# Altium schematic symbol library jlcpcb_2025_04_resistors_extended_1210.schlib: 2670 symbols (part 10 of 14) (continued)
## RC1210FR-0730KL
designator R?  Resistance: 30kΩ  (hidden comment: *)
Resistor, 30kΩ, ±1%, 500mW, ±100ppm/℃, -55℃~+155℃, SMD 1210; Manufacturer: Uniroyal; Manufacturer Part Number: RC1210FR-0730KL; Supplier 1: LCSC; Supplier Part Number 1: C728373; JLCPCB Part Number: C728373; Power Rating: 500mW; Category: Resistors; Package Size: 1210; JLCPCB Basic Part: Yes; Tolerance: ±1%; Temperature Coefficient: ±100ppm/℃; Temperature Rating: -55℃~+155℃; ComponentLink1Description: Datasheet; ComponentLink1URL: https://wmsc.lcsc.com/wmsc/upload/file/pdf/v2/lcsc/2304140030_YAGEO-RC1210FR-0730KL_C728373.pdf; ComponentLink2Description: JLCPCB Part URL; ComponentLink2URL: https://jlcpcb.com/partdetail/C728373
pins: 1, 2
1 alternate drawing of the same symbol

## RC1210FR-0730RL
designator R?  Resistance: 30Ω  (hidden comment: *)
Resistor, 30Ω, ±1%, 500mW, ±100ppm/℃, -55℃~+155℃, SMD 1210; Manufacturer: Uniroyal; Manufacturer Part Number: RC1210FR-0730RL; Supplier 1: LCSC; Supplier Part Number 1: C724011; JLCPCB Part Number: C724011; Power Rating: 500mW; Category: Resistors; Package Size: 1210; JLCPCB Basic Part: Yes; Tolerance: ±1%; Temperature Coefficient: ±100ppm/℃; Temperature Rating: -55℃~+155℃; ComponentLink1Description: Datasheet; ComponentLink1URL: https://wmsc.lcsc.com/wmsc/upload/file/pdf/v2/lcsc/2012102146_YAGEO-RC1210FR-0730RL_C724011.pdf; ComponentLink2Description: JLCPCB Part URL; ComponentLink2URL: https://jlcpcb.com/partdetail/C724011
pins: 1, 2
1 alternate drawing of the same symbol

## RC1210FR-0733KL
designator R?  Resistance: 33kΩ  (hidden comment: *)
Resistor, 33kΩ, ±1%, 500mW, 200V, ±100ppm/℃, -55℃~+155℃, SMD 1210; Manufacturer: Uniroyal; Manufacturer Part Number: RC1210FR-0733KL; Supplier 1: LCSC; Supplier Part Number 1: C874934; JLCPCB Part Number: C874934; Power Rating: 500mW; Category: Resistors; Package Size: 1210; JLCPCB Basic Part: Yes; Tolerance: ±1%; Voltage Rating: 200V; Temperature Coefficient: ±100ppm/℃; Temperature Rating: -55℃~+155℃; ComponentLink1Description: Datasheet; ComponentLink1URL: https://wmsc.lcsc.com/wmsc/upload/file/pdf/v2/lcsc/2112231430_YAGEO-RC1210FR-0733KL_C874934.pdf; ComponentLink2Description: JLCPCB Part URL; ComponentLink2URL: https://jlcpcb.com/partdetail/C874934
pins: 1, 2
1 alternate drawing of the same symbol

## RC1210FR-0733RL
designator R?  Resistance: 33Ω  (hidden comment: *)
Resistor, 33Ω, ±1%, 500mW, ±100ppm/℃, -55℃~+155℃, SMD 1210; Manufacturer: Uniroyal; Manufacturer Part Number: RC1210FR-0733RL; Supplier 1: LCSC; Supplier Part Number 1: C723447; JLCPCB Part Number: C723447; Power Rating: 500mW; Category: Resistors; Package Size: 1210; JLCPCB Basic Part: Yes; Tolerance: ±1%; Temperature Coefficient: ±100ppm/℃; Temperature Rating: -55℃~+155℃; ComponentLink1Description: Datasheet; ComponentLink1URL: https://wmsc.lcsc.com/wmsc/upload/file/pdf/v2/lcsc/2008171306_YAGEO-RC1210FR-0733RL_C723447.pdf; ComponentLink2Description: JLCPCB Part URL; ComponentLink2URL: https://jlcpcb.com/partdetail/C723447
pins: 1, 2
1 alternate drawing of the same symbol

## RC1210FR-0739KL
designator R?  Resistance: 39kΩ  (hidden comment: *)
Resistor, 39kΩ, ±1%, 500mW, 200V, ±100ppm/℃, -55℃~+155℃, SMD 1210; Manufacturer: Uniroyal; Manufacturer Part Number: RC1210FR-0739KL; Supplier 1: LCSC; Supplier Part Number 1: C728378; JLCPCB Part Number: C728378; Power Rating: 500mW; Category: Resistors; Package Size: 1210; JLCPCB Basic Part: Yes; Tolerance: ±1%; Voltage Rating: 200V; Temperature Coefficient: ±100ppm/℃; Temperature Rating: -55℃~+155℃; ComponentLink1Description: Datasheet; ComponentLink1URL: https://wmsc.lcsc.com/wmsc/upload/file/pdf/v2/lcsc/2304140030_YAGEO-RC1210FR-0739KL_C728378.pdf; ComponentLink2Description: JLCPCB Part URL; ComponentLink2URL: https://jlcpcb.com/partdetail/C728378
pins: 1, 2
1 alternate drawing of the same symbol

## RC1210FR-0743RL
designator R?  Resistance: 43Ω  (hidden comment: *)
Resistor, 43Ω, ±1%, 500mW, 200V, ±100ppm/℃, -55℃~+155℃, SMD 1210; Manufacturer: Uniroyal; Manufacturer Part Number: RC1210FR-0743RL; Supplier 1: LCSC; Supplier Part Number 1: C874999; JLCPCB Part Number: C874999; Power Rating: 500mW; Category: Resistors; Package Size: 1210; JLCPCB Basic Part: Yes; Tolerance: ±1%; Voltage Rating: 200V; Temperature Coefficient: ±100ppm/℃; Temperature Rating: -55℃~+155℃; ComponentLink1Description: Datasheet; ComponentLink1URL: https://wmsc.lcsc.com/wmsc/upload/file/pdf/v2/lcsc/2112131830_YAGEO-RC1210FR-0743RL_C874999.pdf; ComponentLink2Description: JLCPCB Part URL; ComponentLink2URL: https://jlcpcb.com/partdetail/C874999
pins: 1, 2
1 alternate drawing of the same symbol

## RC1210FR-0747KL
designator R?  Resistance: 47kΩ  (hidden comment: *)
Resistor, 47kΩ, ±1%, 500mW, ±100ppm/℃, -55℃~+155℃, SMD 1210; Manufacturer: Uniroyal; Manufacturer Part Number: RC1210FR-0747KL; Supplier 1: LCSC; Supplier Part Number 1: C728383; JLCPCB Part Number: C728383; Power Rating: 500mW; Category: Resistors; Package Size: 1210; JLCPCB Basic Part: Yes; Tolerance: ±1%; Temperature Coefficient: ±100ppm/℃; Temperature Rating: -55℃~+155℃; ComponentLink1Description: Datasheet; ComponentLink1URL: https://wmsc.lcsc.com/wmsc/upload/file/pdf/v2/lcsc/2304140030_YAGEO-RC1210FR-0747KL_C728383.pdf; ComponentLink2Description: JLCPCB Part URL; ComponentLink2URL: https://jlcpcb.com/partdetail/C728383
pins: 1, 2
1 alternate drawing of the same symbol

## RC1210FR-0747RL
designator R?  Resistance: 47Ω  (hidden comment: *)
Resistor, 47Ω, ±1%, 500mW, 200V, ±100ppm/℃, -55℃~+155℃, SMD 1210; Manufacturer: Uniroyal; Manufacturer Part Number: RC1210FR-0747RL; Supplier 1: LCSC; Supplier Part Number 1: C718247; JLCPCB Part Number: C718247; Power Rating: 500mW; Category: Resistors; Package Size: 1210; JLCPCB Basic Part: Yes; Tolerance: ±1%; Voltage Rating: 200V; Temperature Coefficient: ±100ppm/℃; Temperature Rating: -55℃~+155℃; ComponentLink1Description: Datasheet; ComponentLink1URL: https://wmsc.lcsc.com/wmsc/upload/file/pdf/v2/lcsc/2009231110_YAGEO-RC1210FR-0747RL_C718247.pdf; ComponentLink2Description: JLCPCB Part URL; ComponentLink2URL: https://jlcpcb.com/partdetail/C718247
pins: 1, 2
1 alternate drawing of the same symbol

## RC1210FR-0749K9L
designator R?  Resistance: 49.9kΩ  (hidden comment: *)
Resistor, 49.9kΩ, ±1%, 500mW, ±100ppm/℃, -55℃~+155℃, SMD 1210; Manufacturer: Uniroyal; Manufacturer Part Number: RC1210FR-0749K9L; Supplier 1: LCSC; Supplier Part Number 1: C875024; JLCPCB Part Number: C875024; Power Rating: 500mW; Category: Resistors; Package Size: 1210; JLCPCB Basic Part: Yes; Tolerance: ±1%; Temperature Coefficient: ±100ppm/℃; Temperature Rating: -55℃~+155℃; ComponentLink1Description: Datasheet; ComponentLink1URL: https://wmsc.lcsc.com/wmsc/upload/file/pdf/v2/lcsc/2203081130_YAGEO-RC1210FR-0749K9L_C875024.pdf; ComponentLink2Description: JLCPCB Part URL; ComponentLink2URL: https://jlcpcb.com/partdetail/C875024
pins: 1, 2
1 alternate drawing of the same symbol

## RC1210FR-0751KL
designator R?  Resistance: 51kΩ  (hidden comment: *)
Resistor, 51kΩ, ±1%, 500mW, 200V, ±100ppm/℃, -55℃~+155℃, SMD 1210; Manufacturer: Uniroyal; Manufacturer Part Number: RC1210FR-0751KL; Supplier 1: LCSC; Supplier Part Number 1: C326793; JLCPCB Part Number: C326793; Power Rating: 500mW; Category: Resistors; Package Size: 1210; JLCPCB Basic Part: Yes; Tolerance: ±1%; Voltage Rating: 200V; Temperature Coefficient: ±100ppm/℃; Temperature Rating: -55℃~+155℃; ComponentLink1Description: Datasheet; ComponentLink1URL: https://wmsc.lcsc.com/wmsc/upload/file/pdf/v2/lcsc/1811141443_YAGEO-RC1210FR-0751KL_C326793.pdf; ComponentLink2Description: JLCPCB Part URL; ComponentLink2URL: https://jlcpcb.com/partdetail/C326793
pins: 1, 2
1 alternate drawing of the same symbol

## RC1210FR-0751R1L
designator R?  Resistance: 51.1Ω  (hidden comment: *)
Resistor, 51.1Ω, ±1%, 500mW, 200V, ±100ppm/℃, -55℃~+155℃, SMD 1210; Manufacturer: Uniroyal; Manufacturer Part Number: RC1210FR-0751R1L; Supplier 1: LCSC; Supplier Part Number 1: C723452; JLCPCB Part Number: C723452; Power Rating: 500mW; Category: Resistors; Package Size: 1210; JLCPCB Basic Part: Yes; Tolerance: ±1%; Voltage Rating: 200V; Temperature Coefficient: ±100ppm/℃; Temperature Rating: -55℃~+155℃; ComponentLink1Description: Datasheet; ComponentLink1URL: https://wmsc.lcsc.com/wmsc/upload/file/pdf/v2/lcsc/2008171306_YAGEO-RC1210FR-0751R1L_C723452.pdf; ComponentLink2Description: JLCPCB Part URL; ComponentLink2URL: https://jlcpcb.com/partdetail/C723452
pins: 1, 2
1 alternate drawing of the same symbol

## RC1210FR-0751RL
designator R?  Resistance: 51Ω  (hidden comment: *)
Resistor, 51Ω, ±1%, 500mW, 200V, ±100ppm/℃, -55℃~+155℃, SMD 1210; Manufacturer: Uniroyal; Manufacturer Part Number: RC1210FR-0751RL; Supplier 1: LCSC; Supplier Part Number 1: C705454; JLCPCB Part Number: C705454; Power Rating: 500mW; Category: Resistors; Package Size: 1210; JLCPCB Basic Part: Yes; Tolerance: ±1%; Voltage Rating: 200V; Temperature Coefficient: ±100ppm/℃; Temperature Rating: -55℃~+155℃; ComponentLink1Description: Datasheet; ComponentLink1URL: https://wmsc.lcsc.com/wmsc/upload/file/pdf/v2/lcsc/2304140030_YAGEO-RC1210FR-0751RL_C705454.pdf; ComponentLink2Description: JLCPCB Part URL; ComponentLink2URL: https://jlcpcb.com/partdetail/C705454
pins: 1, 2
1 alternate drawing of the same symbol

## RC1210FR-0756KL
designator R?  Resistance: 56kΩ  (hidden comment: *)
Resistor, 56kΩ, ±1%, 500mW, 200V, ±100ppm/℃, -55℃~+155℃, SMD 1210; Manufacturer: Uniroyal; Manufacturer Part Number: RC1210FR-0756KL; Supplier 1: LCSC; Supplier Part Number 1: C728388; JLCPCB Part Number: C728388; Power Rating: 500mW; Category: Resistors; Package Size: 1210; JLCPCB Basic Part: Yes; Tolerance: ±1%; Voltage Rating: 200V; Temperature Coefficient: ±100ppm/℃; Temperature Rating: -55℃~+155℃; ComponentLink1Description: Datasheet; ComponentLink1URL: https://wmsc.lcsc.com/wmsc/upload/file/pdf/v2/lcsc/2304140030_YAGEO-RC1210FR-0756KL_C728388.pdf; ComponentLink2Description: JLCPCB Part URL; ComponentLink2URL: https://jlcpcb.com/partdetail/C728388
pins: 1, 2
1 alternate drawing of the same symbol

## RC1210FR-0756RL
designator R?  Resistance: 56Ω  (hidden comment: *)
Resistor, 56Ω, ±1%, 500mW, 200V, ±100ppm/℃, -55℃~+155℃, SMD 1210; Manufacturer: Uniroyal; Manufacturer Part Number: RC1210FR-0756RL; Supplier 1: LCSC; Supplier Part Number 1: C606195; JLCPCB Part Number: C606195; Power Rating: 500mW; Category: Resistors; Package Size: 1210; JLCPCB Basic Part: Yes; Tolerance: ±1%; Voltage Rating: 200V; Temperature Coefficient: ±100ppm/℃; Temperature Rating: -55℃~+155℃; ComponentLink1Description: Datasheet; ComponentLink1URL: https://wmsc.lcsc.com/wmsc/upload/file/pdf/v2/lcsc/2006112331_YAGEO-RC1210FR-0756RL_C606195.pdf; ComponentLink2Description: JLCPCB Part URL; ComponentLink2URL: https://jlcpcb.com/partdetail/C606195
pins: 1, 2
1 alternate drawing of the same symbol

## RC1210FR-0762RL
designator R?  Resistance: 62Ω  (hidden comment: *)
Resistor, 62Ω, ±1%, 500mW, 200V, ±100ppm/℃, -55℃~+155℃, SMD 1210; Manufacturer: Uniroyal; Manufacturer Part Number: RC1210FR-0762RL; Supplier 1: LCSC; Supplier Part Number 1: C705056; JLCPCB Part Number: C705056; Power Rating: 500mW; Category: Resistors; Package Size: 1210; JLCPCB Basic Part: Yes; Tolerance: ±1%; Voltage Rating: 200V; Temperature Coefficient: ±100ppm/℃; Temperature Rating: -55℃~+155℃; ComponentLink1Description: Datasheet; ComponentLink1URL: https://wmsc.lcsc.com/wmsc/upload/file/pdf/v2/lcsc/2304140030_YAGEO-RC1210FR-0762RL_C705056.pdf; ComponentLink2Description: JLCPCB Part URL; ComponentLink2URL: https://jlcpcb.com/partdetail/C705056
pins: 1, 2
1 alternate drawing of the same symbol

## RC1210FR-0768KL
designator R?  Resistance: 68kΩ  (hidden comment: *)
Resistor, 68kΩ, ±1%, 500mW, ±100ppm/℃, -55℃~+155℃, SMD 1210; Manufacturer: Uniroyal; Manufacturer Part Number: RC1210FR-0768KL; Supplier 1: LCSC; Supplier Part Number 1: C875102; JLCPCB Part Number: C875102; Power Rating: 500mW; Category: Resistors; Package Size: 1210; JLCPCB Basic Part: Yes; Tolerance: ±1%; Temperature Coefficient: ±100ppm/℃; Temperature Rating: -55℃~+155℃; ComponentLink1Description: Datasheet; ComponentLink1URL: https://wmsc.lcsc.com/wmsc/upload/file/pdf/v2/lcsc/2404241554_YAGEO-RC1210FR-0768KL_C875102.pdf; ComponentLink2Description: JLCPCB Part URL; ComponentLink2URL: https://jlcpcb.com/partdetail/C875102
pins: 1, 2
1 alternate drawing of the same symbol

## RC1210FR-0768RL
designator R?  Resistance: 68Ω  (hidden comment: *)
Resistor, 68Ω, ±1%, 500mW, 200V, ±100ppm/℃, -55℃~+155℃, SMD 1210; Manufacturer: Uniroyal; Manufacturer Part Number: RC1210FR-0768RL; Supplier 1: LCSC; Supplier Part Number 1: C137091; JLCPCB Part Number: C137091; Power Rating: 500mW; Category: Resistors; Package Size: 1210; JLCPCB Basic Part: Yes; Tolerance: ±1%; Voltage Rating: 200V; Temperature Coefficient: ±100ppm/℃; Temperature Rating: -55℃~+155℃; ComponentLink1Description: Datasheet; ComponentLink1URL: https://wmsc.lcsc.com/wmsc/upload/file/pdf/v2/lcsc/2304140030_YAGEO-RC1210FR-0768RL_C137091.pdf; ComponentLink2Description: JLCPCB Part URL; ComponentLink2URL: https://jlcpcb.com/partdetail/C137091
pins: 1, 2
1 alternate drawing of the same symbol

## RC1210FR-0773R2L
designator R?  Resistance: 73.2Ω  (hidden comment: *)
Resistor, 73.2Ω, ±1%, 500mW, 200V, ±100ppm/℃, -55℃~+155℃, SMD 1210; Manufacturer: Uniroyal; Manufacturer Part Number: RC1210FR-0773R2L; Supplier 1: LCSC; Supplier Part Number 1: C705456; JLCPCB Part Number: C705456; Power Rating: 500mW; Category: Resistors; Package Size: 1210; JLCPCB Basic Part: Yes; Tolerance: ±1%; Voltage Rating: 200V; Temperature Coefficient: ±100ppm/℃; Temperature Rating: -55℃~+155℃; ComponentLink1Description: Datasheet; ComponentLink1URL: https://wmsc.lcsc.com/wmsc/upload/file/pdf/v2/lcsc/2304140030_YAGEO-RC1210FR-0773R2L_C705456.pdf; ComponentLink2Description: JLCPCB Part URL; ComponentLink2URL: https://jlcpcb.com/partdetail/C705456
pins: 1, 2
1 alternate drawing of the same symbol

## RC1210FR-0775KL
designator R?  Resistance: 75kΩ  (hidden comment: *)
Resistor, 75kΩ, ±1%, 500mW, 200V, ±100ppm/℃, -55℃~+155℃, SMD 1210; Manufacturer: Uniroyal; Manufacturer Part Number: RC1210FR-0775KL; Supplier 1: LCSC; Supplier Part Number 1: C606196; JLCPCB Part Number: C606196; Power Rating: 500mW; Category: Resistors; Package Size: 1210; JLCPCB Basic Part: Yes; Tolerance: ±1%; Voltage Rating: 200V; Temperature Coefficient: ±100ppm/℃; Temperature Rating: -55℃~+155℃; ComponentLink1Description: Datasheet; ComponentLink1URL: https://wmsc.lcsc.com/wmsc/upload/file/pdf/v2/lcsc/2006112331_YAGEO-RC1210FR-0775KL_C606196.pdf; ComponentLink2Description: JLCPCB Part URL; ComponentLink2URL: https://jlcpcb.com/partdetail/C606196
pins: 1, 2
1 alternate drawing of the same symbol

## RC1210FR-0775RL
designator R?  Resistance: 75Ω  (hidden comment: *)
Resistor, 75Ω, ±1%, 500mW, 200V, ±100ppm/℃, -55℃~+155℃, SMD 1210; Manufacturer: Uniroyal; Manufacturer Part Number: RC1210FR-0775RL; Supplier 1: LCSC; Supplier Part Number 1: C470030; JLCPCB Part Number: C470030; Power Rating: 500mW; Category: Resistors; Package Size: 1210; JLCPCB Basic Part: Yes; Tolerance: ±1%; Voltage Rating: 200V; Temperature Coefficient: ±100ppm/℃; Temperature Rating: -55℃~+155℃; ComponentLink1Description: Datasheet; ComponentLink1URL: https://wmsc.lcsc.com/wmsc/upload/file/pdf/v2/lcsc/2311211102_YAGEO-RC1210FR-0775RL_C470030.pdf; ComponentLink2Description: JLCPCB Part URL; ComponentLink2URL: https://jlcpcb.com/partdetail/C470030
pins: 1, 2
1 alternate drawing of the same symbol

## RC1210FR-0782KL
designator R?  Resistance: 82kΩ  (hidden comment: *)
Resistor, 82kΩ, ±1%, 500mW, 200V, ±100ppm/℃, -55℃~+155℃, SMD 1210; Manufacturer: Uniroyal; Manufacturer Part Number: RC1210FR-0782KL; Supplier 1: LCSC; Supplier Part Number 1: C728394; JLCPCB Part Number: C728394; Power Rating: 500mW; Category: Resistors; Package Size: 1210; JLCPCB Basic Part: Yes; Tolerance: ±1%; Voltage Rating: 200V; Temperature Coefficient: ±100ppm/℃; Temperature Rating: -55℃~+155℃; ComponentLink1Description: Datasheet; ComponentLink1URL: https://wmsc.lcsc.com/wmsc/upload/file/pdf/v2/lcsc/2304140030_YAGEO-RC1210FR-0782KL_C728394.pdf; ComponentLink2Description: JLCPCB Part URL; ComponentLink2URL: https://jlcpcb.com/partdetail/C728394
pins: 1, 2
1 alternate drawing of the same symbol

## RC1210FR-0788R7L
designator R?  Resistance: 88.7Ω  (hidden comment: *)
Resistor, 88.7Ω, ±1%, 500mW, 200V, ±100ppm/℃, -55℃~+155℃, SMD 1210; Manufacturer: Uniroyal; Manufacturer Part Number: RC1210FR-0788R7L; Supplier 1: LCSC; Supplier Part Number 1: C728396; JLCPCB Part Number: C728396; Power Rating: 500mW; Category: Resistors; Package Size: 1210; JLCPCB Basic Part: Yes; Tolerance: ±1%; Voltage Rating: 200V; Temperature Coefficient: ±100ppm/℃; Temperature Rating: -55℃~+155℃; ComponentLink1Description: Datasheet; ComponentLink1URL: https://wmsc.lcsc.com/wmsc/upload/file/pdf/v2/lcsc/2304140030_YAGEO-RC1210FR-0788R7L_C728396.pdf; ComponentLink2Description: JLCPCB Part URL; ComponentLink2URL: https://jlcpcb.com/partdetail/C728396
pins: 1, 2
1 alternate drawing of the same symbol

## RC1210FR-0790R9L
designator R?  Resistance: 90.9Ω  (hidden comment: *)
Resistor, 90.9Ω, ±1%, 500mW, 200V, ±100ppm/℃, -55℃~+155℃, SMD 1210; Manufacturer: Uniroyal; Manufacturer Part Number: RC1210FR-0790R9L; Supplier 1: LCSC; Supplier Part Number 1: C723481; JLCPCB Part Number: C723481; Power Rating: 500mW; Category: Resistors; Package Size: 1210; JLCPCB Basic Part: Yes; Tolerance: ±1%; Voltage Rating: 200V; Temperature Coefficient: ±100ppm/℃; Temperature Rating: -55℃~+155℃; ComponentLink1Description: Datasheet; ComponentLink1URL: https://wmsc.lcsc.com/wmsc/upload/file/pdf/v2/lcsc/2008171307_YAGEO-RC1210FR-0790R9L_C723481.pdf; ComponentLink2Description: JLCPCB Part URL; ComponentLink2URL: https://jlcpcb.com/partdetail/C723481
pins: 1, 2
1 alternate drawing of the same symbol

## RC1210FR-07100KL
designator R?  Resistance: 100kΩ  (hidden comment: *)
Resistor, 100kΩ, ±1%, 500mW, 200V, ±100ppm/℃, -55℃~+155℃, SMD 1210; Manufacturer: Uniroyal; Manufacturer Part Number: RC1210FR-07100KL; Supplier 1: LCSC; Supplier Part Number 1: C375531; JLCPCB Part Number: C375531; Power Rating: 500mW; Category: Resistors; Package Size: 1210; JLCPCB Basic Part: Yes; Tolerance: ±1%; Voltage Rating: 200V; Temperature Coefficient: ±100ppm/℃; Temperature Rating: -55℃~+155℃; ComponentLink1Description: Datasheet; ComponentLink1URL: https://wmsc.lcsc.com/wmsc/upload/file/pdf/v2/lcsc/1912111437_YAGEO-RC1210FR-07100KL_C375531.pdf; ComponentLink2Description: JLCPCB Part URL; ComponentLink2URL: https://jlcpcb.com/partdetail/C375531
pins: 1, 2
1 alternate drawing of the same symbol

## RC1210FR-07110KL
designator R?  Resistance: 110kΩ  (hidden comment: *)
Resistor, 110kΩ, ±1%, 500mW, 200V, ±100ppm/℃, -55℃~+155℃, SMD 1210; Manufacturer: Uniroyal; Manufacturer Part Number: RC1210FR-07110KL; Supplier 1: LCSC; Supplier Part Number 1: C728358; JLCPCB Part Number: C728358; Power Rating: 500mW; Category: Resistors; Package Size: 1210; JLCPCB Basic Part: Yes; Tolerance: ±1%; Voltage Rating: 200V; Temperature Coefficient: ±100ppm/℃; Temperature Rating: -55℃~+155℃; ComponentLink1Description: Datasheet; ComponentLink1URL: https://wmsc.lcsc.com/wmsc/upload/file/pdf/v2/lcsc/2304140030_YAGEO-RC1210FR-07110KL_C728358.pdf; ComponentLink2Description: JLCPCB Part URL; ComponentLink2URL: https://jlcpcb.com/partdetail/C728358
pins: 1, 2
1 alternate drawing of the same symbol

## RC1210FR-07115KL
designator R?  Resistance: 115kΩ  (hidden comment: *)
Resistor, 115kΩ, ±1%, 500mW, ±100ppm/℃, -55℃~+155℃, SMD 1210; Manufacturer: Uniroyal; Manufacturer Part Number: RC1210FR-07115KL; Supplier 1: LCSC; Supplier Part Number 1: C723646; JLCPCB Part Number: C723646; Power Rating: 500mW; Category: Resistors; Package Size: 1210; JLCPCB Basic Part: Yes; Tolerance: ±1%; Temperature Coefficient: ±100ppm/℃; Temperature Rating: -55℃~+155℃; ComponentLink1Description: Datasheet; ComponentLink1URL: https://wmsc.lcsc.com/wmsc/upload/file/pdf/v2/lcsc/2008171335_YAGEO-RC1210FR-07115KL_C723646.pdf; ComponentLink2Description: JLCPCB Part URL; ComponentLink2URL: https://jlcpcb.com/partdetail/C723646
pins: 1, 2
1 alternate drawing of the same symbol

## RC1210FR-07120RL
designator R?  Resistance: 120Ω  (hidden comment: *)
Resistor, 120Ω, ±1%, 500mW, 200V, ±100ppm/℃, -55℃~+155℃, SMD 1210; Manufacturer: Uniroyal; Manufacturer Part Number: RC1210FR-07120RL; Supplier 1: LCSC; Supplier Part Number 1: C137105; JLCPCB Part Number: C137105; Power Rating: 500mW; Category: Resistors; Package Size: 1210; JLCPCB Basic Part: Yes; Tolerance: ±1%; Voltage Rating: 200V; Temperature Coefficient: ±100ppm/℃; Temperature Rating: -55℃~+155℃; ComponentLink1Description: Datasheet; ComponentLink1URL: https://wmsc.lcsc.com/wmsc/upload/file/pdf/v2/lcsc/2304140030_YAGEO-RC1210FR-07120RL_C137105.pdf; ComponentLink2Description: JLCPCB Part URL; ComponentLink2URL: https://jlcpcb.com/partdetail/C137105
pins: 1, 2
1 alternate drawing of the same symbol

## RC1210FR-07121RL
designator R?  Resistance: 121Ω  (hidden comment: *)
Resistor, 121Ω, ±1%, 500mW, 200V, ±100ppm/℃, -55℃~+155℃, SMD 1210; Manufacturer: Uniroyal; Manufacturer Part Number: RC1210FR-07121RL; Supplier 1: LCSC; Supplier Part Number 1: C874691; JLCPCB Part Number: C874691; Power Rating: 500mW; Category: Resistors; Package Size: 1210; JLCPCB Basic Part: Yes; Tolerance: ±1%; Voltage Rating: 200V; Temperature Coefficient: ±100ppm/℃; Temperature Rating: -55℃~+155℃; ComponentLink1Description: Datasheet; ComponentLink1URL: https://wmsc.lcsc.com/wmsc/upload/file/pdf/v2/lcsc/2201242130_YAGEO-RC1210FR-07121RL_C874691.pdf; ComponentLink2Description: JLCPCB Part URL; ComponentLink2URL: https://jlcpcb.com/partdetail/C874691
pins: 1, 2
1 alternate drawing of the same symbol

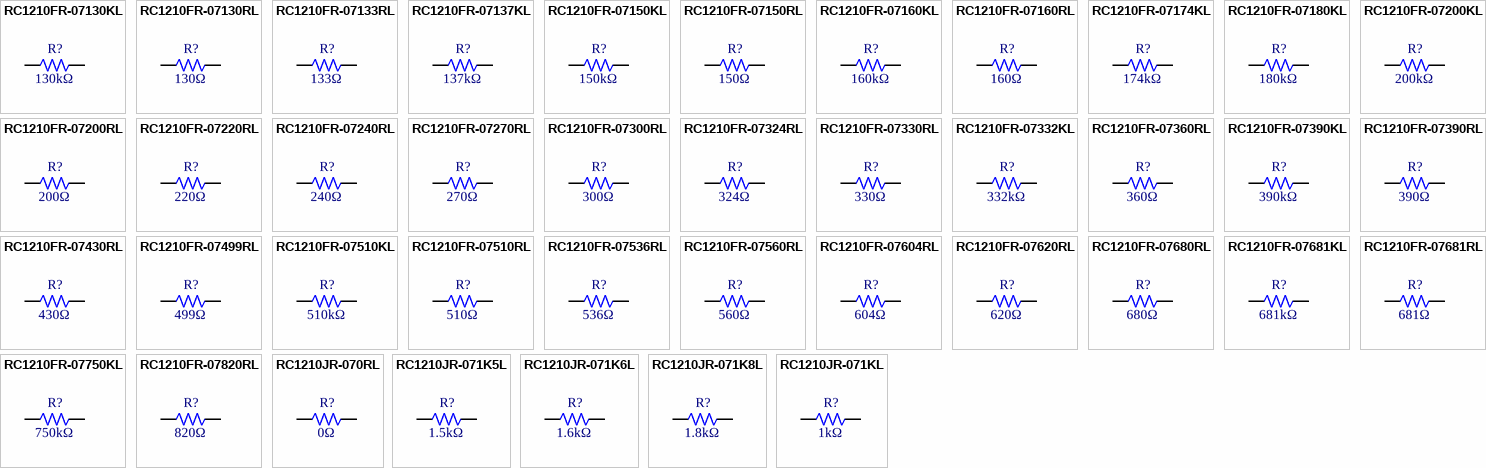
[diagram p48: symbols RC1210FR-07130KL to RC1210JR-071KL]

## RC1210FR-07130KL
designator R?  Resistance: 130kΩ  (hidden comment: *)
Resistor, 130kΩ, ±1%, 500mW, 200V, ±100ppm/℃, -55℃~+155℃, SMD 1210; Manufacturer: Uniroyal; Manufacturer Part Number: RC1210FR-07130KL; Supplier 1: LCSC; Supplier Part Number 1: C874703; JLCPCB Part Number: C874703; Power Rating: 500mW; Category: Resistors; Package Size: 1210; JLCPCB Basic Part: Yes; Tolerance: ±1%; Voltage Rating: 200V; Temperature Coefficient: ±100ppm/℃; Temperature Rating: -55℃~+155℃; ComponentLink1Description: Datasheet; ComponentLink1URL: https://wmsc.lcsc.com/wmsc/upload/file/pdf/v2/lcsc/2201242130_YAGEO-RC1210FR-07130KL_C874703.pdf; ComponentLink2Description: JLCPCB Part URL; ComponentLink2URL: https://jlcpcb.com/partdetail/C874703
pins: 1, 2
1 alternate drawing of the same symbol

## RC1210FR-07130RL
designator R?  Resistance: 130Ω  (hidden comment: *)
Resistor, 130Ω, ±1%, 500mW, 200V, ±100ppm/℃, -55℃~+155℃, SMD 1210; Manufacturer: Uniroyal; Manufacturer Part Number: RC1210FR-07130RL; Supplier 1: LCSC; Supplier Part Number 1: C728362; JLCPCB Part Number: C728362; Power Rating: 500mW; Category: Resistors; Package Size: 1210; JLCPCB Basic Part: Yes; Tolerance: ±1%; Voltage Rating: 200V; Temperature Coefficient: ±100ppm/℃; Temperature Rating: -55℃~+155℃; ComponentLink1Description: Datasheet; ComponentLink1URL: https://wmsc.lcsc.com/wmsc/upload/file/pdf/v2/lcsc/2304140030_YAGEO-RC1210FR-07130RL_C728362.pdf; ComponentLink2Description: JLCPCB Part URL; ComponentLink2URL: https://jlcpcb.com/partdetail/C728362
pins: 1, 2
1 alternate drawing of the same symbol

## RC1210FR-07133RL
designator R?  Resistance: 133Ω  (hidden comment: *)
Resistor, 133Ω, ±1%, 500mW, 200V, ±100ppm/℃, -55℃~+155℃, SMD 1210; Manufacturer: Uniroyal; Manufacturer Part Number: RC1210FR-07133RL; Supplier 1: LCSC; Supplier Part Number 1: C723673; JLCPCB Part Number: C723673; Power Rating: 500mW; Category: Resistors; Package Size: 1210; JLCPCB Basic Part: Yes; Tolerance: ±1%; Voltage Rating: 200V; Temperature Coefficient: ±100ppm/℃; Temperature Rating: -55℃~+155℃; ComponentLink1Description: Datasheet; ComponentLink1URL: https://wmsc.lcsc.com/wmsc/upload/file/pdf/v2/lcsc/2008201237_YAGEO-RC1210FR-07133RL_C723673.pdf; ComponentLink2Description: JLCPCB Part URL; ComponentLink2URL: https://jlcpcb.com/partdetail/C723673
pins: 1, 2
1 alternate drawing of the same symbol

## RC1210FR-07137KL
designator R?  Resistance: 137kΩ  (hidden comment: *)
Resistor, 137kΩ, ±1%, 500mW, 200V, ±100ppm/℃, -55℃~+155℃, SMD 1210; Manufacturer: Uniroyal; Manufacturer Part Number: RC1210FR-07137KL; Supplier 1: LCSC; Supplier Part Number 1: C137104; JLCPCB Part Number: C137104; Power Rating: 500mW; Category: Resistors; Package Size: 1210; JLCPCB Basic Part: Yes; Tolerance: ±1%; Voltage Rating: 200V; Temperature Coefficient: ±100ppm/℃; Temperature Rating: -55℃~+155℃; ComponentLink1Description: Datasheet; ComponentLink1URL: https://wmsc.lcsc.com/wmsc/upload/file/pdf/v2/lcsc/2304140030_YAGEO-RC1210FR-07137KL_C137104.pdf; ComponentLink2Description: JLCPCB Part URL; ComponentLink2URL: https://jlcpcb.com/partdetail/C137104
pins: 1, 2
1 alternate drawing of the same symbol

## RC1210FR-07150KL
designator R?  Resistance: 150kΩ  (hidden comment: *)
Resistor, 150kΩ, ±1%, 500mW, 200V, ±100ppm/℃, -55℃~+155℃, SMD 1210; Manufacturer: Uniroyal; Manufacturer Part Number: RC1210FR-07150KL; Supplier 1: LCSC; Supplier Part Number 1: C137103; JLCPCB Part Number: C137103; Power Rating: 500mW; Category: Resistors; Package Size: 1210; JLCPCB Basic Part: Yes; Tolerance: ±1%; Voltage Rating: 200V; Temperature Coefficient: ±100ppm/℃; Temperature Rating: -55℃~+155℃; ComponentLink1Description: Datasheet; ComponentLink1URL: https://wmsc.lcsc.com/wmsc/upload/file/pdf/v2/lcsc/2304140030_YAGEO-RC1210FR-07150KL_C137103.pdf; ComponentLink2Description: JLCPCB Part URL; ComponentLink2URL: https://jlcpcb.com/partdetail/C137103
pins: 1, 2
1 alternate drawing of the same symbol

## RC1210FR-07150RL
designator R?  Resistance: 150Ω  (hidden comment: *)
Resistor, 150Ω, ±1%, 500mW, ±100ppm/℃, -55℃~+155℃, SMD 1210; Manufacturer: Uniroyal; Manufacturer Part Number: RC1210FR-07150RL; Supplier 1: LCSC; Supplier Part Number 1: C874724; JLCPCB Part Number: C874724; Power Rating: 500mW; Category: Resistors; Package Size: 1210; JLCPCB Basic Part: Yes; Tolerance: ±1%; Temperature Coefficient: ±100ppm/℃; Temperature Rating: -55℃~+155℃; ComponentLink1Description: Datasheet; ComponentLink1URL: https://wmsc.lcsc.com/wmsc/upload/file/pdf/v2/lcsc/2210201630_YAGEO-RC1210FR-07150RL_C874724.pdf; ComponentLink2Description: JLCPCB Part URL; ComponentLink2URL: https://jlcpcb.com/partdetail/C874724
pins: 1, 2
1 alternate drawing of the same symbol

## RC1210FR-07160KL
designator R?  Resistance: 160kΩ  (hidden comment: *)
Resistor, 160kΩ, ±1%, 500mW, ±100ppm/℃, -55℃~+155℃, SMD 1210; Manufacturer: Uniroyal; Manufacturer Part Number: RC1210FR-07160KL; Supplier 1: LCSC; Supplier Part Number 1: C728363; JLCPCB Part Number: C728363; Power Rating: 500mW; Category: Resistors; Package Size: 1210; JLCPCB Basic Part: Yes; Tolerance: ±1%; Temperature Coefficient: ±100ppm/℃; Temperature Rating: -55℃~+155℃; ComponentLink1Description: Datasheet; ComponentLink1URL: https://wmsc.lcsc.com/wmsc/upload/file/pdf/v2/lcsc/2304140030_YAGEO-RC1210FR-07160KL_C728363.pdf; ComponentLink2Description: JLCPCB Part URL; ComponentLink2URL: https://jlcpcb.com/partdetail/C728363
pins: 1, 2
1 alternate drawing of the same symbol

## RC1210FR-07160RL
designator R?  Resistance: 160Ω  (hidden comment: *)
Resistor, 160Ω, ±1%, 500mW, 200V, ±100ppm/℃, -55℃~+155℃, SMD 1210; Manufacturer: Uniroyal; Manufacturer Part Number: RC1210FR-07160RL; Supplier 1: LCSC; Supplier Part Number 1: C784589; JLCPCB Part Number: C784589; Power Rating: 500mW; Category: Resistors; Package Size: 1210; JLCPCB Basic Part: Yes; Tolerance: ±1%; Voltage Rating: 200V; Temperature Coefficient: ±100ppm/℃; Temperature Rating: -55℃~+155℃; ComponentLink1Description: Datasheet; ComponentLink1URL: https://wmsc.lcsc.com/wmsc/upload/file/pdf/v2/lcsc/2011271106_YAGEO-RC1210FR-07160RL_C784589.pdf; ComponentLink2Description: JLCPCB Part URL; ComponentLink2URL: https://jlcpcb.com/partdetail/C784589
pins: 1, 2
1 alternate drawing of the same symbol

## RC1210FR-07174KL
designator R?  Resistance: 174kΩ  (hidden comment: *)
Resistor, 174kΩ, ±1%, 500mW, 200V, ±100ppm/℃, -55℃~+155℃, SMD 1210; Manufacturer: Uniroyal; Manufacturer Part Number: RC1210FR-07174KL; Supplier 1: LCSC; Supplier Part Number 1: C275640; JLCPCB Part Number: C275640; Power Rating: 500mW; Category: Resistors; Package Size: 1210; JLCPCB Basic Part: Yes; Tolerance: ±1%; Voltage Rating: 200V; Temperature Coefficient: ±100ppm/℃; Temperature Rating: -55℃~+155℃; ComponentLink1Description: Datasheet; ComponentLink1URL: https://wmsc.lcsc.com/wmsc/upload/file/pdf/v2/lcsc/2304140030_YAGEO-RC1210FR-07174KL_C275640.pdf; ComponentLink2Description: JLCPCB Part URL; ComponentLink2URL: https://jlcpcb.com/partdetail/C275640
pins: 1, 2
1 alternate drawing of the same symbol

## RC1210FR-07180KL
designator R?  Resistance: 180kΩ  (hidden comment: *)
Resistor, 180kΩ, ±1%, 500mW, ±100ppm/℃, -55℃~+155℃, SMD 1210; Manufacturer: Uniroyal; Manufacturer Part Number: RC1210FR-07180KL; Supplier 1: LCSC; Supplier Part Number 1: C728364; JLCPCB Part Number: C728364; Power Rating: 500mW; Category: Resistors; Package Size: 1210; JLCPCB Basic Part: Yes; Tolerance: ±1%; Temperature Coefficient: ±100ppm/℃; Temperature Rating: -55℃~+155℃; ComponentLink1Description: Datasheet; ComponentLink1URL: https://wmsc.lcsc.com/wmsc/upload/file/pdf/v2/lcsc/2304140030_YAGEO-RC1210FR-07180KL_C728364.pdf; ComponentLink2Description: JLCPCB Part URL; ComponentLink2URL: https://jlcpcb.com/partdetail/C728364
pins: 1, 2
1 alternate drawing of the same symbol

## RC1210FR-07200KL
designator R?  Resistance: 200kΩ  (hidden comment: *)
Resistor, 200kΩ, ±1%, 500mW, 200V, ±100ppm/℃, -55℃~+155℃, SMD 1210; Manufacturer: Uniroyal; Manufacturer Part Number: RC1210FR-07200KL; Supplier 1: LCSC; Supplier Part Number 1: C83148; JLCPCB Part Number: C83148; Power Rating: 500mW; Category: Resistors; Package Size: 1210; JLCPCB Basic Part: Yes; Tolerance: ±1%; Voltage Rating: 200V; Temperature Coefficient: ±100ppm/℃; Temperature Rating: -55℃~+155℃; ComponentLink1Description: Datasheet; ComponentLink1URL: https://wmsc.lcsc.com/wmsc/upload/file/pdf/v2/lcsc/2304140030_YAGEO-RC1210FR-07200KL_C83148.pdf; ComponentLink2Description: JLCPCB Part URL; ComponentLink2URL: https://jlcpcb.com/partdetail/C83148
pins: 1, 2
1 alternate drawing of the same symbol

## RC1210FR-07200RL
designator R?  Resistance: 200Ω  (hidden comment: *)
Resistor, 200Ω, ±1%, 500mW, 200V, ±100ppm/℃, -55℃~+155℃, SMD 1210; Manufacturer: Uniroyal; Manufacturer Part Number: RC1210FR-07200RL; Supplier 1: LCSC; Supplier Part Number 1: C728367; JLCPCB Part Number: C728367; Power Rating: 500mW; Category: Resistors; Package Size: 1210; JLCPCB Basic Part: Yes; Tolerance: ±1%; Voltage Rating: 200V; Temperature Coefficient: ±100ppm/℃; Temperature Rating: -55℃~+155℃; ComponentLink1Description: Datasheet; ComponentLink1URL: https://wmsc.lcsc.com/wmsc/upload/file/pdf/v2/lcsc/2304140030_YAGEO-RC1210FR-07200RL_C728367.pdf; ComponentLink2Description: JLCPCB Part URL; ComponentLink2URL: https://jlcpcb.com/partdetail/C728367
pins: 1, 2
1 alternate drawing of the same symbol

## RC1210FR-07220RL
designator R?  Resistance: 220Ω  (hidden comment: *)
Resistor, 220Ω, ±1%, 500mW, 200V, ±100ppm/℃, -55℃~+155℃, SMD 1210; Manufacturer: Uniroyal; Manufacturer Part Number: RC1210FR-07220RL; Supplier 1: LCSC; Supplier Part Number 1: C137099; JLCPCB Part Number: C137099; Power Rating: 500mW; Category: Resistors; Package Size: 1210; JLCPCB Basic Part: Yes; Tolerance: ±1%; Voltage Rating: 200V; Temperature Coefficient: ±100ppm/℃; Temperature Rating: -55℃~+155℃; ComponentLink1Description: Datasheet; ComponentLink1URL: https://wmsc.lcsc.com/wmsc/upload/file/pdf/v2/lcsc/2304140030_YAGEO-RC1210FR-07220RL_C137099.pdf; ComponentLink2Description: JLCPCB Part URL; ComponentLink2URL: https://jlcpcb.com/partdetail/C137099
pins: 1, 2
1 alternate drawing of the same symbol

## RC1210FR-07240RL
designator R?  Resistance: 240Ω  (hidden comment: *)
Resistor, 240Ω, ±1%, 500mW, 200V, ±100ppm/℃, -55℃~+155℃, SMD 1210; Manufacturer: Uniroyal; Manufacturer Part Number: RC1210FR-07240RL; Supplier 1: LCSC; Supplier Part Number 1: C163354; JLCPCB Part Number: C163354; Power Rating: 500mW; Category: Resistors; Package Size: 1210; JLCPCB Basic Part: Yes; Tolerance: ±1%; Voltage Rating: 200V; Temperature Coefficient: ±100ppm/℃; Temperature Rating: -55℃~+155℃; ComponentLink1Description: Datasheet; ComponentLink1URL: https://wmsc.lcsc.com/wmsc/upload/file/pdf/v2/lcsc/2304140030_YAGEO-RC1210FR-07240RL_C163354.pdf; ComponentLink2Description: JLCPCB Part URL; ComponentLink2URL: https://jlcpcb.com/partdetail/C163354
pins: 1, 2
1 alternate drawing of the same symbol

## RC1210FR-07270RL
designator R?  Resistance: 270Ω  (hidden comment: *)
Resistor, 270Ω, ±1%, 500mW, 200V, ±100ppm/℃, -55℃~+155℃, SMD 1210; Manufacturer: Uniroyal; Manufacturer Part Number: RC1210FR-07270RL; Supplier 1: LCSC; Supplier Part Number 1: C83145; JLCPCB Part Number: C83145; Power Rating: 500mW; Category: Resistors; Package Size: 1210; JLCPCB Basic Part: Yes; Tolerance: ±1%; Voltage Rating: 200V; Temperature Coefficient: ±100ppm/℃; Temperature Rating: -55℃~+155℃; ComponentLink1Description: Datasheet; ComponentLink1URL: https://wmsc.lcsc.com/wmsc/upload/file/pdf/v2/lcsc/2005111002_YAGEO-RC1210FR-07270RL_C83145.pdf; ComponentLink2Description: JLCPCB Part URL; ComponentLink2URL: https://jlcpcb.com/partdetail/C83145
pins: 1, 2
1 alternate drawing of the same symbol

## RC1210FR-07300RL
designator R?  Resistance: 300Ω  (hidden comment: *)
Resistor, 300Ω, ±1%, 500mW, 200V, ±100ppm/℃, -55℃~+155℃, SMD 1210; Manufacturer: Uniroyal; Manufacturer Part Number: RC1210FR-07300RL; Supplier 1: LCSC; Supplier Part Number 1: C137096; JLCPCB Part Number: C137096; Power Rating: 500mW; Category: Resistors; Package Size: 1210; JLCPCB Basic Part: Yes; Tolerance: ±1%; Voltage Rating: 200V; Temperature Coefficient: ±100ppm/℃; Temperature Rating: -55℃~+155℃; ComponentLink1Description: Datasheet; ComponentLink1URL: https://wmsc.lcsc.com/wmsc/upload/file/pdf/v2/lcsc/2304140030_YAGEO-RC1210FR-07300RL_C137096.pdf; ComponentLink2Description: JLCPCB Part URL; ComponentLink2URL: https://jlcpcb.com/partdetail/C137096
pins: 1, 2
1 alternate drawing of the same symbol

## RC1210FR-07324RL
designator R?  Resistance: 324Ω  (hidden comment: *)
Resistor, 324Ω, ±1%, 500mW, 200V, ±100ppm/℃, -55℃~+155℃, SMD 1210; Manufacturer: Uniroyal; Manufacturer Part Number: RC1210FR-07324RL; Supplier 1: LCSC; Supplier Part Number 1: C705055; JLCPCB Part Number: C705055; Power Rating: 500mW; Category: Resistors; Package Size: 1210; JLCPCB Basic Part: Yes; Tolerance: ±1%; Voltage Rating: 200V; Temperature Coefficient: ±100ppm/℃; Temperature Rating: -55℃~+155℃; ComponentLink1Description: Datasheet; ComponentLink1URL: https://wmsc.lcsc.com/wmsc/upload/file/pdf/v2/lcsc/2304140030_YAGEO-RC1210FR-07324RL_C705055.pdf; ComponentLink2Description: JLCPCB Part URL; ComponentLink2URL: https://jlcpcb.com/partdetail/C705055
pins: 1, 2
1 alternate drawing of the same symbol

## RC1210FR-07330RL
designator R?  Resistance: 330Ω  (hidden comment: *)
Resistor, 330Ω, ±1%, 500mW, 200V, ±100ppm/℃, -55℃~+155℃, SMD 1210; Manufacturer: Uniroyal; Manufacturer Part Number: RC1210FR-07330RL; Supplier 1: LCSC; Supplier Part Number 1: C163353; JLCPCB Part Number: C163353; Power Rating: 500mW; Category: Resistors; Package Size: 1210; JLCPCB Basic Part: Yes; Tolerance: ±1%; Voltage Rating: 200V; Temperature Coefficient: ±100ppm/℃; Temperature Rating: -55℃~+155℃; ComponentLink1Description: Datasheet; ComponentLink1URL: https://wmsc.lcsc.com/wmsc/upload/file/pdf/v2/lcsc/2304140030_YAGEO-RC1210FR-07330RL_C163353.pdf; ComponentLink2Description: JLCPCB Part URL; ComponentLink2URL: https://jlcpcb.com/partdetail/C163353
pins: 1, 2
1 alternate drawing of the same symbol

## RC1210FR-07332KL
designator R?  Resistance: 332kΩ  (hidden comment: *)
Resistor, 332kΩ, ±1%, 500mW, ±100ppm/℃, -55℃~+155℃, SMD 1210; Manufacturer: Uniroyal; Manufacturer Part Number: RC1210FR-07332KL; Supplier 1: LCSC; Supplier Part Number 1: C728374; JLCPCB Part Number: C728374; Power Rating: 500mW; Category: Resistors; Package Size: 1210; JLCPCB Basic Part: Yes; Tolerance: ±1%; Temperature Coefficient: ±100ppm/℃; Temperature Rating: -55℃~+155℃; ComponentLink1Description: Datasheet; ComponentLink1URL: https://wmsc.lcsc.com/wmsc/upload/file/pdf/v2/lcsc/2304140030_YAGEO-RC1210FR-07332KL_C728374.pdf; ComponentLink2Description: JLCPCB Part URL; ComponentLink2URL: https://jlcpcb.com/partdetail/C728374
pins: 1, 2
1 alternate drawing of the same symbol

## RC1210FR-07360RL
designator R?  Resistance: 360Ω  (hidden comment: *)
Resistor, 360Ω, ±1%, 500mW, 200V, ±100ppm/℃, -55℃~+155℃, SMD 1210; Manufacturer: Uniroyal; Manufacturer Part Number: RC1210FR-07360RL; Supplier 1: LCSC; Supplier Part Number 1: C728375; JLCPCB Part Number: C728375; Power Rating: 500mW; Category: Resistors; Package Size: 1210; JLCPCB Basic Part: Yes; Tolerance: ±1%; Voltage Rating: 200V; Temperature Coefficient: ±100ppm/℃; Temperature Rating: -55℃~+155℃; ComponentLink1Description: Datasheet; ComponentLink1URL: https://wmsc.lcsc.com/wmsc/upload/file/pdf/v2/lcsc/2304140030_YAGEO-RC1210FR-07360RL_C728375.pdf; ComponentLink2Description: JLCPCB Part URL; ComponentLink2URL: https://jlcpcb.com/partdetail/C728375
pins: 1, 2
1 alternate drawing of the same symbol

## RC1210FR-07390KL
designator R?  Resistance: 390kΩ  (hidden comment: *)
Resistor, 390kΩ, ±1%, 500mW, ±100ppm/℃, -55℃~+155℃, SMD 1210; Manufacturer: Uniroyal; Manufacturer Part Number: RC1210FR-07390KL; Supplier 1: LCSC; Supplier Part Number 1: C728376; JLCPCB Part Number: C728376; Power Rating: 500mW; Category: Resistors; Package Size: 1210; JLCPCB Basic Part: Yes; Tolerance: ±1%; Temperature Coefficient: ±100ppm/℃; Temperature Rating: -55℃~+155℃; ComponentLink1Description: Datasheet; ComponentLink1URL: https://wmsc.lcsc.com/wmsc/upload/file/pdf/v2/lcsc/2304140030_YAGEO-RC1210FR-07390KL_C728376.pdf; ComponentLink2Description: JLCPCB Part URL; ComponentLink2URL: https://jlcpcb.com/partdetail/C728376
pins: 1, 2
1 alternate drawing of the same symbol

## RC1210FR-07390RL
designator R?  Resistance: 390Ω  (hidden comment: *)
Resistor, 390Ω, ±1%, 500mW, 200V, ±100ppm/℃, -55℃~+155℃, SMD 1210; Manufacturer: Uniroyal; Manufacturer Part Number: RC1210FR-07390RL; Supplier 1: LCSC; Supplier Part Number 1: C728377; JLCPCB Part Number: C728377; Power Rating: 500mW; Category: Resistors; Package Size: 1210; JLCPCB Basic Part: Yes; Tolerance: ±1%; Voltage Rating: 200V; Temperature Coefficient: ±100ppm/℃; Temperature Rating: -55℃~+155℃; ComponentLink1Description: Datasheet; ComponentLink1URL: https://wmsc.lcsc.com/wmsc/upload/file/pdf/v2/lcsc/2304140030_YAGEO-RC1210FR-07390RL_C728377.pdf; ComponentLink2Description: JLCPCB Part URL; ComponentLink2URL: https://jlcpcb.com/partdetail/C728377
pins: 1, 2
1 alternate drawing of the same symbol

## RC1210FR-07430RL
designator R?  Resistance: 430Ω  (hidden comment: *)
Resistor, 430Ω, ±1%, 500mW, ±100ppm/℃, -55℃~+155℃, SMD 1210; Manufacturer: Uniroyal; Manufacturer Part Number: RC1210FR-07430RL; Supplier 1: LCSC; Supplier Part Number 1: C728382; JLCPCB Part Number: C728382; Power Rating: 500mW; Category: Resistors; Package Size: 1210; JLCPCB Basic Part: Yes; Tolerance: ±1%; Temperature Coefficient: ±100ppm/℃; Temperature Rating: -55℃~+155℃; ComponentLink1Description: Datasheet; ComponentLink1URL: https://wmsc.lcsc.com/wmsc/upload/file/pdf/v2/lcsc/2304140030_YAGEO-RC1210FR-07430RL_C728382.pdf; ComponentLink2Description: JLCPCB Part URL; ComponentLink2URL: https://jlcpcb.com/partdetail/C728382
pins: 1, 2
1 alternate drawing of the same symbol

## RC1210FR-07499RL
designator R?  Resistance: 499Ω  (hidden comment: *)
Resistor, 499Ω, ±1%, 500mW, ±100ppm/℃, -55℃~+155℃, SMD 1210; Manufacturer: Uniroyal; Manufacturer Part Number: RC1210FR-07499RL; Supplier 1: LCSC; Supplier Part Number 1: C728384; JLCPCB Part Number: C728384; Power Rating: 500mW; Category: Resistors; Package Size: 1210; JLCPCB Basic Part: Yes; Tolerance: ±1%; Temperature Coefficient: ±100ppm/℃; Temperature Rating: -55℃~+155℃; ComponentLink1Description: Datasheet; ComponentLink1URL: https://wmsc.lcsc.com/wmsc/upload/file/pdf/v2/lcsc/2304140030_YAGEO-RC1210FR-07499RL_C728384.pdf; ComponentLink2Description: JLCPCB Part URL; ComponentLink2URL: https://jlcpcb.com/partdetail/C728384
pins: 1, 2
1 alternate drawing of the same symbol

## RC1210FR-07510KL
designator R?  Resistance: 510kΩ  (hidden comment: *)
Resistor, 510kΩ, ±1%, 500mW, 200V, ±100ppm/℃, -55℃~+155℃, SMD 1210; Manufacturer: Uniroyal; Manufacturer Part Number: RC1210FR-07510KL; Supplier 1: LCSC; Supplier Part Number 1: C326794; JLCPCB Part Number: C326794; Power Rating: 500mW; Category: Resistors; Package Size: 1210; JLCPCB Basic Part: Yes; Tolerance: ±1%; Voltage Rating: 200V; Temperature Coefficient: ±100ppm/℃; Temperature Rating: -55℃~+155℃; ComponentLink1Description: Datasheet; ComponentLink1URL: https://wmsc.lcsc.com/wmsc/upload/file/pdf/v2/lcsc/1811141241_YAGEO-RC1210FR-07510KL_C326794.pdf; ComponentLink2Description: JLCPCB Part URL; ComponentLink2URL: https://jlcpcb.com/partdetail/C326794
pins: 1, 2
1 alternate drawing of the same symbol